# Altium footprint library PCB_Library.PcbLib: 110 footprints (part 1 of 7)
Each footprint in its own frame and in the unit in brackets; x right, y up, seen from the top. Pads: shape width x height; smd on the part's side, far side on the other; paste and mask are expansions set on the pad; w line width, h text height; cw(c..) or ccw(c..) is an arc to the next point about the centre after c.
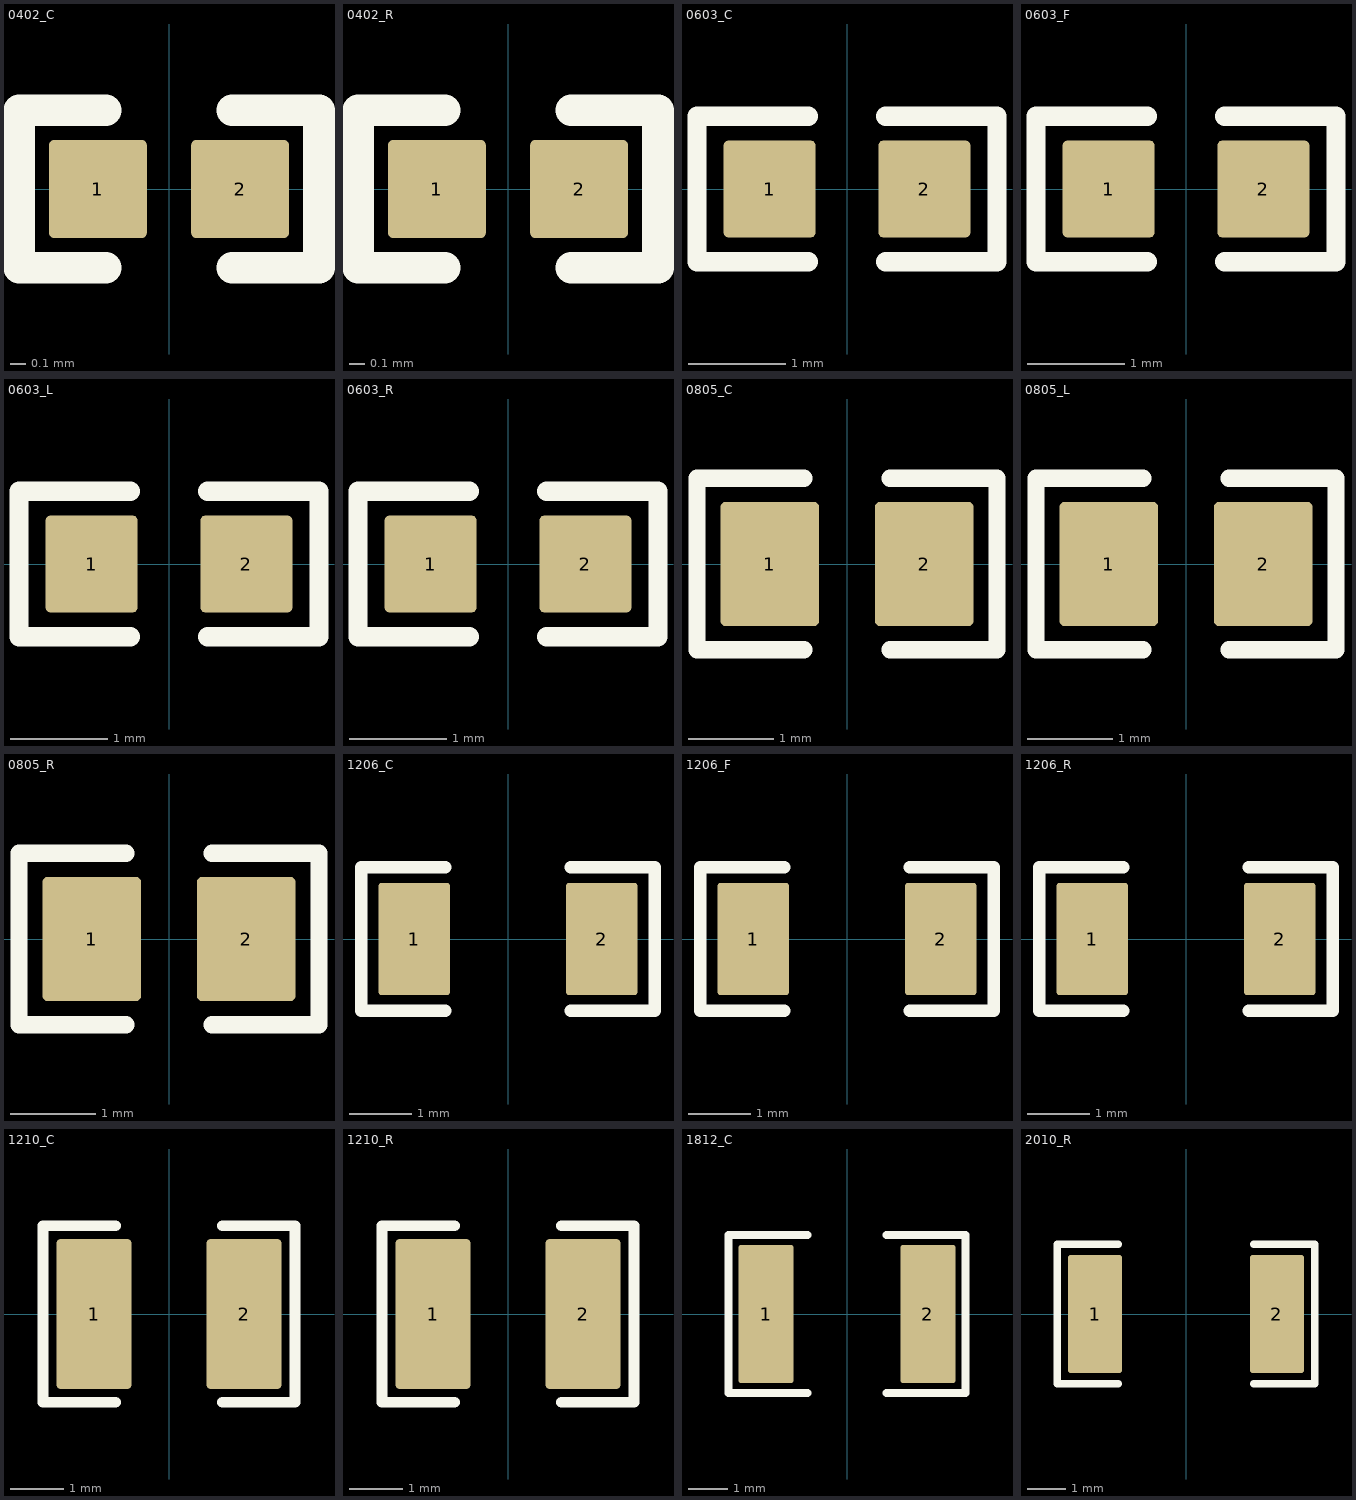
[diagram p0: the footprints below, top view; thin cyan lines are the x and y axes]

## 0402_C [mm]
pads (2):
  rrect10% 0.62x0.62 smd paste-0.03 mask+0.05: 1(-0.45,0) 2(0.45,0)
Top Overlay:
  lines w0.2: -0.4,-0.5 -0.95,-0.5 -0.95,0.5 -0.4,0.5 ; 0.4,-0.5 0.95,-0.5 0.95,0.5 0.4,0.5
3D body "0402_CAP.step": height 0.4, standoff 0, extent -0.55,-0.3 0.55,0.3

## 0402_R [mm]
pads (2):
  rrect10% 0.62x0.62 smd paste-0.03 mask+0.05: 1(-0.45,0) 2(0.45,0)
Top Overlay:
  lines w0.2: -0.4,-0.5 -0.95,-0.5 -0.95,0.5 -0.4,0.5 ; 0.4,-0.5 0.95,-0.5 0.95,0.5 0.4,0.5
3D body "asdf.step": height 0.5, standoff 0, extent -0.55,-0.3 0.55,0.3

## 0603_C [mm]
pads (2):
  rrect10% 0.95x1 smd paste-0.05 mask+0.05: 1(-0.8,0) 2(0.8,0)
Top Overlay:
  lines w0.2: -0.4,-0.75 -1.55,-0.75 -1.55,0.75 -0.4,0.75 ; 0.4,-0.75 1.55,-0.75 1.55,0.75 0.4,0.75
3D body "Chip2PinSM127P600-8N.step": height 0.8, standoff 0, extent -0.875,-0.475 0.875,0.475

## 0603_F [mm]
pads (2):
  rrect10% 0.95x1 smd paste-0.05 mask+0.05: 1(-0.8,0) 2(0.8,0)
Top Overlay:
  lines w0.2: -0.4,-0.75 -1.55,-0.75 -1.55,0.75 -0.4,0.75 ; 0.4,-0.75 1.55,-0.75 1.55,0.75 0.4,0.75
3D body "Fuse_Bourns_Inc_SF-0603S050-2_eec.STEP": height 0.55, standoff 0, extent -0.775,-0.4 0.825,0.4

## 0603_L [mm]
pads (2):
  rrect10% 0.95x1 smd paste-0.05 mask+0.05: 1(-0.8,0) 2(0.8,0)
Top Overlay:
  lines w0.2: -0.4,-0.75 -1.55,-0.75 -1.55,0.75 -0.4,0.75 ; 0.4,-0.75 1.55,-0.75 1.55,0.75 0.4,0.75
3D body "0603l.step": height 0.8, standoff 0, extent -0.875,-0.475 0.875,0.475

## 0603_R [mm]
pads (2):
  rrect10% 0.95x1 smd paste-0.05 mask+0.05: 1(-0.8,0) 2(0.8,0)
Top Overlay:
  lines w0.2: -0.4,-0.75 -1.55,-0.75 -1.55,0.75 -0.4,0.75 ; 0.4,-0.75 1.55,-0.75 1.55,0.75 0.4,0.75
3D body "0603_RES.step": height 0.8, standoff 0, extent -0.875,-0.475 0.875,0.475

## 0805_C [mm]
pads (2):
  rrect10% 1.15x1.45 smd paste-0.07 mask+0.05: 1(-0.9,0) 2(0.9,0)
Top Overlay:
  lines w0.2: -0.5,-1 -1.75,-1 -1.75,1 -0.5,1 ; 0.5,-1 1.75,-1 1.75,1 0.5,1
3D body "y.step": height 1, standoff 0, extent -1.1,-0.725 1.1,0.725

## 0805_L [mm]
pads (2):
  rrect10% 1.15x1.45 smd paste-0.07 mask+0.05: 1(-0.9,0) 2(0.9,0)
Top Overlay:
  lines w0.2: -0.5,-1 -1.75,-1 -1.75,1 -0.5,1 ; 0.5,-1 1.75,-1 1.75,1 0.5,1
3D body "0805l.step": height 1, standoff 0, extent -1.1,-0.725 1.1,0.725

## 0805_R [mm]
pads (2):
  rrect10% 1.15x1.45 smd paste-0.07 mask+0.05: 1(-0.9,0) 2(0.9,0)
Top Overlay:
  lines w0.2: -0.5,-1 -1.75,-1 -1.75,1 -0.5,1 ; 0.5,-1 1.75,-1 1.75,1 0.5,1
3D body "0805_r.step": height 0.8, standoff 0, extent -1.1,-0.725 1.1,0.725

## 1206_C [mm]
pads (2):
  rrect10% 1.15x1.8 smd paste-0.08 mask+0.05: 1(-1.5,0) 2(1.5,0)
Top Overlay:
  lines w0.2: -1,-1.15 -2.35,-1.15 -2.35,1.15 -1,1.15 ; 1,-1.15 2.35,-1.15 2.35,1.15 1,1.15
3D body "ca.step": height 1.6, standoff 0, extent -1.7,-0.9 1.7,0.9

## 1206_F [mm]
pads (2):
  rrect10% 1.15x1.8 smd paste-0.08 mask+0.05: 1(-1.5,0) 2(1.5,0)
Top Overlay:
  lines w0.2: -1,-1.15 -2.35,-1.15 -2.35,1.15 -1,1.15 ; 1,-1.15 2.35,-1.15 2.35,1.15 1,1.15
3D body "Fuse_Littelfuse_Inc_0466_250NR_eec.STEP": height 0.66, standoff 0, extent -1.587,-0.75 1.587,0.774

## 1206_R [mm]
pads (2):
  rrect10% 1.15x1.8 smd paste-0.08 mask+0.05: 1(-1.5,0) 2(1.5,0)
Top Overlay:
  lines w0.2: -1,-1.15 -2.35,-1.15 -2.35,1.15 -1,1.15 ; 1,-1.15 2.35,-1.15 2.35,1.15 1,1.15
3D body "1206_r.step": height 0.8, standoff 0, extent -1.7,-0.9 1.7,0.9

## 1210_C [mm]
pads (2):
  rrect10% 1.4x2.8 smd paste-0.1 mask+0.05: 1(-1.4,0) 2(1.4,0)
Top Overlay:
  lines w0.2: -1,-1.65 -2.35,-1.65 -2.35,1.65 -1,1.65 ; 1,-1.65 2.35,-1.65 2.35,1.65 1,1.65
3D body "1210c.step": height 2, standoff 0, extent -1.7,-1.35 1.7,1.35

## 1210_R [mm]
pads (2):
  rrect10% 1.4x2.8 smd paste-0.1 mask+0.05: 1(-1.4,0) 2(1.4,0)
Top Overlay:
  lines w0.2: -1,-1.65 -2.35,-1.65 -2.35,1.65 -1,1.65 ; 1,-1.65 2.35,-1.65 2.35,1.65 1,1.65
3D body "1210_r.step": height 0.8, standoff 0, extent -1.7,-1.35 1.7,1.35

## 1812_C [mm]
pads (2):
  rrect10% 1.4x3.5 smd paste-0.1 mask+0.05: 1(-2.05,0) 2(2.05,0)
Top Overlay:
  lines w0.2: -1,-2 -3,-2 -3,2 -1,2 ; 1,-2 3,-2 3,2 1,2
3D body "1812c.step": height 2, standoff 0, extent -2.4,-1.75 2.4,1.75

## 2010_R [mm]
pads (2):
  rrect10% 1.4x3.05 smd paste-0.1 mask+0.05: 1(-2.35,0) 2(2.35,0)
Top Overlay:
  lines w0.2: -1.75,-1.8 -3.325,-1.8 -3.325,1.8 -1.75,1.8 ; 1.75,-1.8 3.325,-1.8 3.325,1.8 1.75,1.8
3D body "WSL2010 (0.007 to 0.5).stp": height 0.64, standoff 0, extent -2.54,-1.27 2.54,1.27